# Altium footprint library Test.PcbLib: 245 footprints (part 5 of 17)
Each footprint in its own frame and in the unit in brackets; x right, y up, seen from the top. Pads: shape width x height; smd on the part's side, far side on the other; paste and mask are expansions set on the pad; w line width, h text height; cw(c..) or ccw(c..) is an arc to the next point about the centre after c.
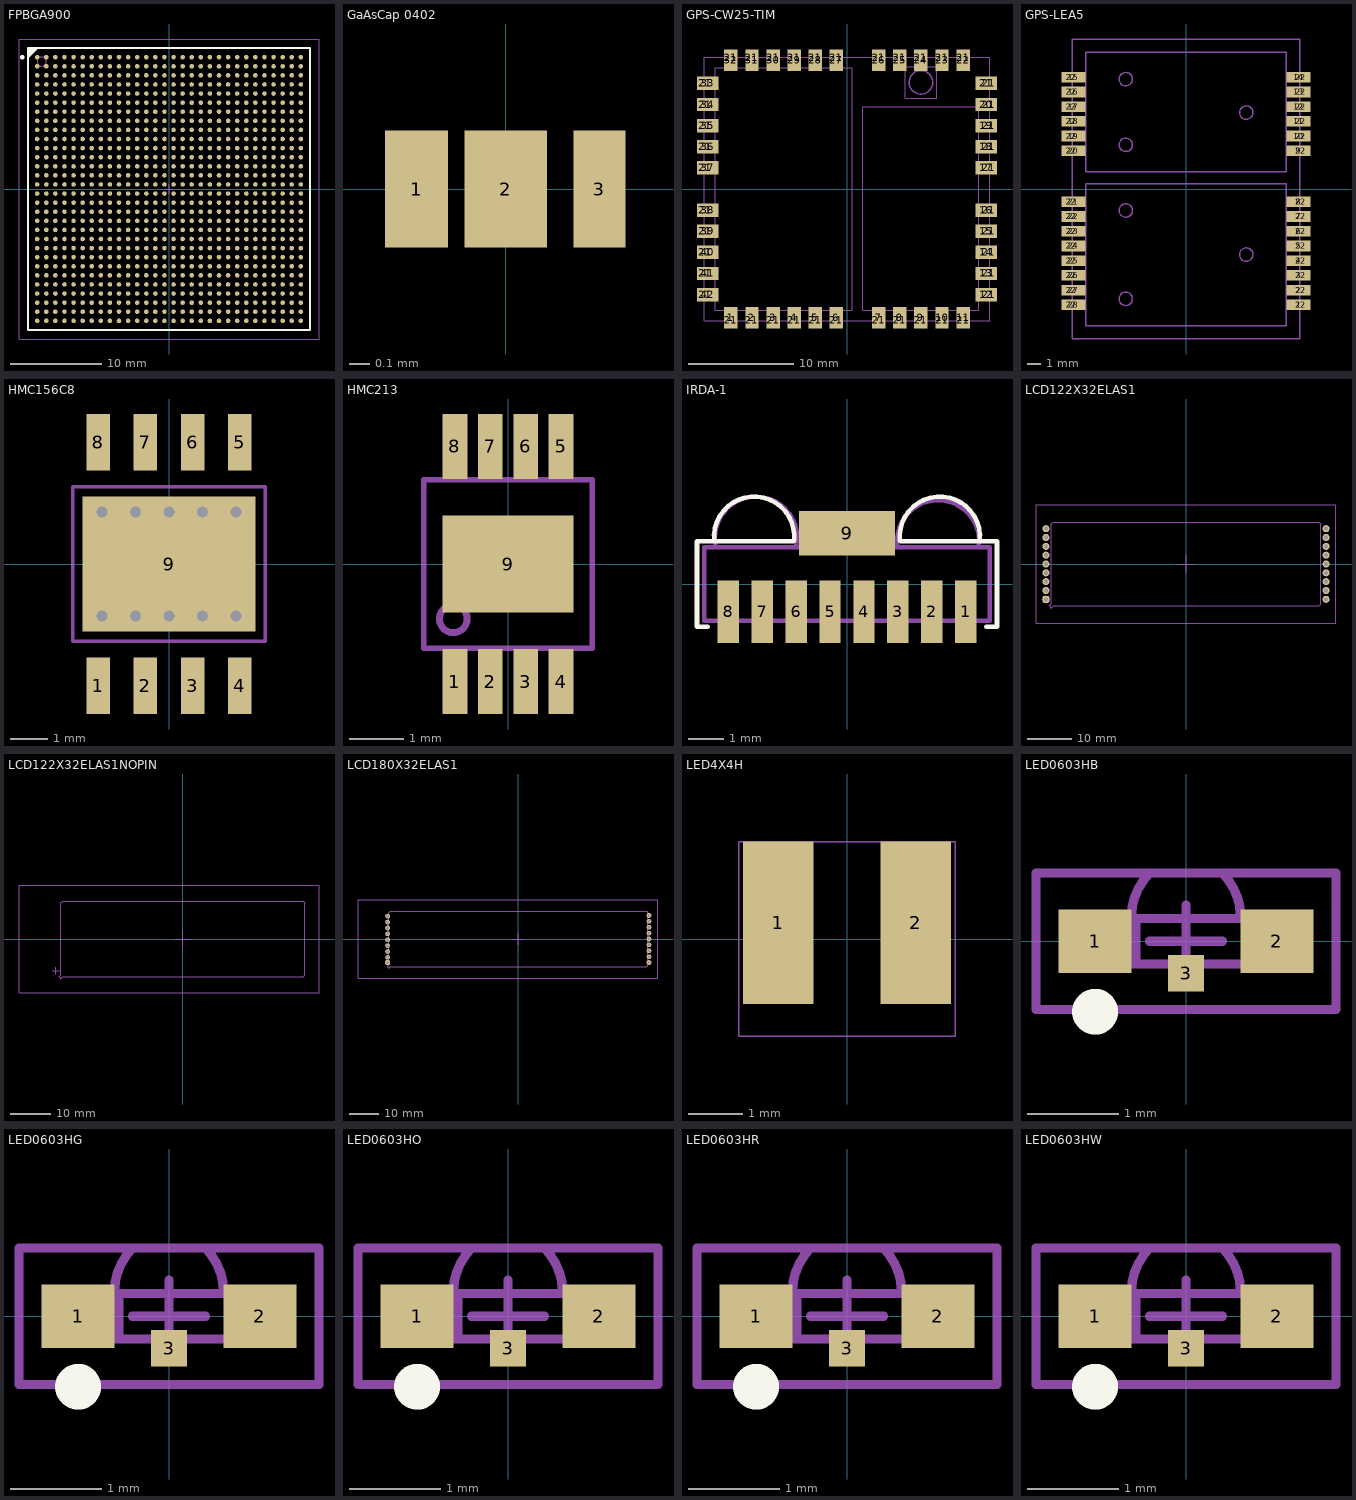
[diagram p4: the footprints below, top view; thin cyan lines are the x and y axes]

## FPBGA900 [mm] "BGA, 900-Leads, Body 31,0x31,0mm,  Pitch 1,00mm"
height 2.15
pads (900):
  round 0.5 smd: A1(-14.5,14.5) A2(-13.5,14.5) A3(-12.5,14.5) A4(-11.5,14.5) A5(-10.5,14.5) A6(-9.5,14.5) A7(-8.5,14.5) A8(-7.5,14.5) A9(-6.5,14.5) A10(-5.5,14.5) A11(-4.5,14.5) A12(-3.5,14.5) A13(-2.5,14.5) A14(-1.5,14.5) A15(-0.5,14.5) A16(0.5,14.5) A17(1.5,14.5) A18(2.5,14.5) A19(3.5,14.5) A20(4.5,14.5) A21(5.5,14.5) A22(6.5,14.5) A23(7.5,14.5) A24(8.5,14.5) A25(9.5,14.5) A26(10.5,14.5) A27(11.5,14.5) A28(12.5,14.5) A29(13.5,14.5) A30(14.5,14.5) AA1(-14.5,-5.5) AA2(-13.5,-5.5) AA3(-12.5,-5.5) AA4(-11.5,-5.5) AA5(-10.5,-5.5) AA6(-9.5,-5.5) AA7(-8.5,-5.5) AA8(-7.5,-5.5) AA9(-6.5,-5.5) AA10(-5.5,-5.5) AA11(-4.5,-5.5) AA12(-3.5,-5.5) AA13(-2.5,-5.5) AA14(-1.5,-5.5) AA15(-0.5,-5.5) AA16(0.5,-5.5) AA17(1.5,-5.5) AA18(2.5,-5.5) AA19(3.5,-5.5) AA20(4.5,-5.5) AA21(5.5,-5.5) AA22(6.5,-5.5) AA23(7.5,-5.5) AA24(8.5,-5.5) AA25(9.5,-5.5) AA26(10.5,-5.5) AA27(11.5,-5.5) AA28(12.5,-5.5) AA29(13.5,-5.5) AA30(14.5,-5.5) AB1(-14.5,-6.5) AB2(-13.5,-6.5) AB3(-12.5,-6.5) AB4(-11.5,-6.5) AB5(-10.5,-6.5) AB6(-9.5,-6.5) AB7(-8.5,-6.5) AB8(-7.5,-6.5) AB9(-6.5,-6.5) AB10(-5.5,-6.5) AB11(-4.5,-6.5) AB12(-3.5,-6.5) AB13(-2.5,-6.5) AB14(-1.5,-6.5) AB15(-0.5,-6.5) AB16(0.5,-6.5) AB17(1.5,-6.5) AB18(2.5,-6.5) AB19(3.5,-6.5) AB20(4.5,-6.5) AB21(5.5,-6.5) AB22(6.5,-6.5) AB23(7.5,-6.5) AB24(8.5,-6.5) AB25(9.5,-6.5) AB26(10.5,-6.5) AB27(11.5,-6.5) AB28(12.5,-6.5) AB29(13.5,-6.5) AB30(14.5,-6.5) AC1(-14.5,-7.5) AC2(-13.5,-7.5) AC3(-12.5,-7.5) AC4(-11.5,-7.5) AC5(-10.5,-7.5) AC6(-9.5,-7.5) AC7(-8.5,-7.5) AC8(-7.5,-7.5) AC9(-6.5,-7.5) AC10(-5.5,-7.5) AC11(-4.5,-7.5) AC12(-3.5,-7.5) AC13(-2.5,-7.5) AC14(-1.5,-7.5) AC15(-0.5,-7.5) AC16(0.5,-7.5) AC17(1.5,-7.5) AC18(2.5,-7.5) AC19(3.5,-7.5) AC20(4.5,-7.5) AC21(5.5,-7.5) AC22(6.5,-7.5) AC23(7.5,-7.5) AC24(8.5,-7.5) AC25(9.5,-7.5) AC26(10.5,-7.5) AC27(11.5,-7.5) AC28(12.5,-7.5) AC29(13.5,-7.5) AC30(14.5,-7.5) AD1(-14.5,-8.5) AD2(-13.5,-8.5) AD3(-12.5,-8.5) AD4(-11.5,-8.5) AD5(-10.5,-8.5) AD6(-9.5,-8.5) AD7(-8.5,-8.5) AD8(-7.5,-8.5) AD9(-6.5,-8.5) AD10(-5.5,-8.5) AD11(-4.5,-8.5) AD12(-3.5,-8.5) AD13(-2.5,-8.5) AD14(-1.5,-8.5) AD15(-0.5,-8.5) AD16(0.5,-8.5) AD17(1.5,-8.5) AD18(2.5,-8.5) AD19(3.5,-8.5) AD20(4.5,-8.5) AD21(5.5,-8.5) AD22(6.5,-8.5) AD23(7.5,-8.5) AD24(8.5,-8.5) AD25(9.5,-8.5) AD26(10.5,-8.5) AD27(11.5,-8.5) AD28(12.5,-8.5) AD29(13.5,-8.5) AD30(14.5,-8.5) AE1(-14.5,-9.5) AE2(-13.5,-9.5) AE3(-12.5,-9.5) AE4(-11.5,-9.5) AE5(-10.5,-9.5) AE6(-9.5,-9.5) AE7(-8.5,-9.5) AE8(-7.5,-9.5) AE9(-6.5,-9.5) AE10(-5.5,-9.5) AE11(-4.5,-9.5) AE12(-3.5,-9.5) AE13(-2.5,-9.5) AE14(-1.5,-9.5) AE15(-0.5,-9.5) AE16(0.5,-9.5) AE17(1.5,-9.5) AE18(2.5,-9.5) AE19(3.5,-9.5) AE20(4.5,-9.5) AE21(5.5,-9.5) AE22(6.5,-9.5) AE23(7.5,-9.5) AE24(8.5,-9.5) AE25(9.5,-9.5) AE26(10.5,-9.5) AE27(11.5,-9.5) AE28(12.5,-9.5) AE29(13.5,-9.5) AE30(14.5,-9.5) AF1(-14.5,-10.5) AF2(-13.5,-10.5) AF3(-12.5,-10.5) AF4(-11.5,-10.5) AF5(-10.5,-10.5) AF6(-9.5,-10.5) AF7(-8.5,-10.5) AF8(-7.5,-10.5) AF9(-6.5,-10.5) AF10(-5.5,-10.5) AF11(-4.5,-10.5) AF12(-3.5,-10.5) AF13(-2.5,-10.5) AF14(-1.5,-10.5) AF15(-0.5,-10.5) AF16(0.5,-10.5) AF17(1.5,-10.5) AF18(2.5,-10.5) AF19(3.5,-10.5) AF20(4.5,-10.5) AF21(5.5,-10.5) AF22(6.5,-10.5) AF23(7.5,-10.5) AF24(8.5,-10.5) AF25(9.5,-10.5) AF26(10.5,-10.5) AF27(11.5,-10.5) AF28(12.5,-10.5) AF29(13.5,-10.5) AF30(14.5,-10.5) AG1(-14.5,-11.5) AG2(-13.5,-11.5) AG3(-12.5,-11.5) AG4(-11.5,-11.5) AG5(-10.5,-11.5) AG6(-9.5,-11.5) AG7(-8.5,-11.5) AG8(-7.5,-11.5) AG9(-6.5,-11.5) AG10(-5.5,-11.5) AG11(-4.5,-11.5) AG12(-3.5,-11.5) AG13(-2.5,-11.5) AG14(-1.5,-11.5) AG15(-0.5,-11.5) AG16(0.5,-11.5) AG17(1.5,-11.5) AG18(2.5,-11.5) AG19(3.5,-11.5) AG20(4.5,-11.5) AG21(5.5,-11.5) AG22(6.5,-11.5) AG23(7.5,-11.5) AG24(8.5,-11.5) AG25(9.5,-11.5) AG26(10.5,-11.5) AG27(11.5,-11.5) AG28(12.5,-11.5) AG29(13.5,-11.5) AG30(14.5,-11.5) AH1(-14.5,-12.5) AH2(-13.5,-12.5) AH3(-12.5,-12.5) AH4(-11.5,-12.5) AH5(-10.5,-12.5) AH6(-9.5,-12.5) AH7(-8.5,-12.5) AH8(-7.5,-12.5) AH9(-6.5,-12.5) AH10(-5.5,-12.5) AH11(-4.5,-12.5) AH12(-3.5,-12.5) AH13(-2.5,-12.5) AH14(-1.5,-12.5) AH15(-0.5,-12.5) AH16(0.5,-12.5) AH17(1.5,-12.5) AH18(2.5,-12.5) AH19(3.5,-12.5) AH20(4.5,-12.5) AH21(5.5,-12.5) AH22(6.5,-12.5) AH23(7.5,-12.5) AH24(8.5,-12.5) AH25(9.5,-12.5) AH26(10.5,-12.5) AH27(11.5,-12.5) AH28(12.5,-12.5) AH29(13.5,-12.5) AH30(14.5,-12.5) AJ1(-14.5,-13.5) AJ2(-13.5,-13.5) AJ3(-12.5,-13.5) AJ4(-11.5,-13.5) AJ5(-10.5,-13.5) AJ6(-9.5,-13.5) AJ7(-8.5,-13.5) AJ8(-7.5,-13.5) AJ9(-6.5,-13.5) AJ10(-5.5,-13.5) AJ11(-4.5,-13.5) AJ12(-3.5,-13.5) AJ13(-2.5,-13.5) AJ14(-1.5,-13.5) AJ15(-0.5,-13.5) AJ16(0.5,-13.5) AJ17(1.5,-13.5) AJ18(2.5,-13.5) AJ19(3.5,-13.5) AJ20(4.5,-13.5) AJ21(5.5,-13.5) AJ22(6.5,-13.5) AJ23(7.5,-13.5) AJ24(8.5,-13.5) AJ25(9.5,-13.5) AJ26(10.5,-13.5) AJ27(11.5,-13.5) AJ28(12.5,-13.5) AJ29(13.5,-13.5) AJ30(14.5,-13.5) AK1(-14.5,-14.5) AK2(-13.5,-14.5) AK3(-12.5,-14.5) AK4(-11.5,-14.5) AK5(-10.5,-14.5) AK6(-9.5,-14.5) AK7(-8.5,-14.5) AK8(-7.5,-14.5) AK9(-6.5,-14.5) AK10(-5.5,-14.5) AK11(-4.5,-14.5) AK12(-3.5,-14.5) AK13(-2.5,-14.5) AK14(-1.5,-14.5) AK15(-0.5,-14.5) AK16(0.5,-14.5) AK17(1.5,-14.5) AK18(2.5,-14.5) AK19(3.5,-14.5) AK20(4.5,-14.5) AK21(5.5,-14.5) AK22(6.5,-14.5) AK23(7.5,-14.5) AK24(8.5,-14.5) AK25(9.5,-14.5) AK26(10.5,-14.5) AK27(11.5,-14.5) AK28(12.5,-14.5) AK29(13.5,-14.5) AK30(14.5,-14.5) B1(-14.5,13.5) B2(-13.5,13.5) B3(-12.5,13.5) B4(-11.5,13.5) B5(-10.5,13.5) B6(-9.5,13.5) B7(-8.5,13.5) B8(-7.5,13.5) B9(-6.5,13.5) B10(-5.5,13.5) B11(-4.5,13.5) B12(-3.5,13.5) B13(-2.5,13.5) B14(-1.5,13.5) B15(-0.5,13.5) B16(0.5,13.5) B17(1.5,13.5) B18(2.5,13.5) B19(3.5,13.5) B20(4.5,13.5) B21(5.5,13.5) B22(6.5,13.5) B23(7.5,13.5) B24(8.5,13.5) B25(9.5,13.5) B26(10.5,13.5) B27(11.5,13.5) B28(12.5,13.5) B29(13.5,13.5) B30(14.5,13.5) C1(-14.5,12.5) C2(-13.5,12.5) C3(-12.5,12.5) C4(-11.5,12.5) C5(-10.5,12.5) C6(-9.5,12.5) C7(-8.5,12.5) C8(-7.5,12.5) C9(-6.5,12.5) C10(-5.5,12.5) C11(-4.5,12.5) C12(-3.5,12.5) C13(-2.5,12.5) C14(-1.5,12.5) C15(-0.5,12.5) C16(0.5,12.5) C17(1.5,12.5) C18(2.5,12.5) C19(3.5,12.5) C20(4.5,12.5) C21(5.5,12.5) C22(6.5,12.5) C23(7.5,12.5) C24(8.5,12.5) C25(9.5,12.5) C26(10.5,12.5) C27(11.5,12.5) C28(12.5,12.5) C29(13.5,12.5) C30(14.5,12.5) D1(-14.5,11.5) D2(-13.5,11.5) D3(-12.5,11.5) D4(-11.5,11.5) D5(-10.5,11.5) D6(-9.5,11.5) D7(-8.5,11.5) D8(-7.5,11.5) D9(-6.5,11.5) D10(-5.5,11.5) D11(-4.5,11.5) D12(-3.5,11.5) D13(-2.5,11.5) D14(-1.5,11.5) D15(-0.5,11.5) D16(0.5,11.5) D17(1.5,11.5) D18(2.5,11.5) D19(3.5,11.5) D20(4.5,11.5) D21(5.5,11.5) D22(6.5,11.5) D23(7.5,11.5) D24(8.5,11.5) D25(9.5,11.5) D26(10.5,11.5) D27(11.5,11.5) D28(12.5,11.5) D29(13.5,11.5) D30(14.5,11.5) E1(-14.5,10.5) E2(-13.5,10.5) E3(-12.5,10.5) E4(-11.5,10.5) E5(-10.5,10.5) E6(-9.5,10.5) E7(-8.5,10.5) E8(-7.5,10.5) E9(-6.5,10.5) E10(-5.5,10.5) E11(-4.5,10.5) E12(-3.5,10.5) E13(-2.5,10.5) E14(-1.5,10.5) E15(-0.5,10.5) E16(0.5,10.5) E17(1.5,10.5) E18(2.5,10.5) E19(3.5,10.5) E20(4.5,10.5) E21(5.5,10.5) E22(6.5,10.5) E23(7.5,10.5) E24(8.5,10.5) E25(9.5,10.5) E26(10.5,10.5) E27(11.5,10.5) E28(12.5,10.5) E29(13.5,10.5) E30(14.5,10.5) F1(-14.5,9.5) F2(-13.5,9.5) F3(-12.5,9.5) F4(-11.5,9.5) F5(-10.5,9.5) F6(-9.5,9.5) F7(-8.5,9.5) F8(-7.5,9.5) F9(-6.5,9.5) F10(-5.5,9.5) F11(-4.5,9.5) F12(-3.5,9.5) F13(-2.5,9.5) F14(-1.5,9.5) F15(-0.5,9.5) F16(0.5,9.5) F17(1.5,9.5) F18(2.5,9.5) F19(3.5,9.5) F20(4.5,9.5) F21(5.5,9.5) F22(6.5,9.5) F23(7.5,9.5) F24(8.5,9.5) F25(9.5,9.5) F26(10.5,9.5) F27(11.5,9.5) F28(12.5,9.5) F29(13.5,9.5) F30(14.5,9.5) G1(-14.5,8.5) G2(-13.5,8.5) G3(-12.5,8.5) G4(-11.5,8.5) G5(-10.5,8.5) G6(-9.5,8.5) G7(-8.5,8.5) G8(-7.5,8.5) G9(-6.5,8.5) G10(-5.5,8.5) G11(-4.5,8.5) G12(-3.5,8.5) G13(-2.5,8.5) G14(-1.5,8.5) G15(-0.5,8.5) G16(0.5,8.5) G17(1.5,8.5) G18(2.5,8.5) G19(3.5,8.5) G20(4.5,8.5) G21(5.5,8.5) G22(6.5,8.5) G23(7.5,8.5) G24(8.5,8.5) G25(9.5,8.5) G26(10.5,8.5) G27(11.5,8.5) G28(12.5,8.5) G29(13.5,8.5) G30(14.5,8.5) H1(-14.5,7.5) H2(-13.5,7.5) H3(-12.5,7.5) H4(-11.5,7.5) H5(-10.5,7.5) H6(-9.5,7.5) H7(-8.5,7.5) H8(-7.5,7.5) H9(-6.5,7.5) H10(-5.5,7.5) H11(-4.5,7.5) H12(-3.5,7.5) H13(-2.5,7.5) H14(-1.5,7.5) H15(-0.5,7.5) H16(0.5,7.5) H17(1.5,7.5) H18(2.5,7.5) H19(3.5,7.5) H20(4.5,7.5) H21(5.5,7.5) H22(6.5,7.5) H23(7.5,7.5) H24(8.5,7.5) H25(9.5,7.5) H26(10.5,7.5) H27(11.5,7.5) H28(12.5,7.5) H29(13.5,7.5) H30(14.5,7.5) J1(-14.5,6.5) J2(-13.5,6.5) J3(-12.5,6.5) J4(-11.5,6.5) J5(-10.5,6.5) J6(-9.5,6.5) J7(-8.5,6.5) J8(-7.5,6.5) J9(-6.5,6.5) J10(-5.5,6.5) J11(-4.5,6.5) J12(-3.5,6.5) J13(-2.5,6.5) J14(-1.5,6.5) J15(-0.5,6.5) J16(0.5,6.5) J17(1.5,6.5) J18(2.5,6.5) J19(3.5,6.5) J20(4.5,6.5) J21(5.5,6.5) J22(6.5,6.5) J23(7.5,6.5) J24(8.5,6.5) J25(9.5,6.5) J26(10.5,6.5) J27(11.5,6.5) J28(12.5,6.5) J29(13.5,6.5) J30(14.5,6.5) K1(-14.5,5.5) K2(-13.5,5.5) K3(-12.5,5.5) K4(-11.5,5.5) K5(-10.5,5.5) K6(-9.5,5.5) K7(-8.5,5.5) K8(-7.5,5.5) K9(-6.5,5.5) K10(-5.5,5.5) K11(-4.5,5.5) K12(-3.5,5.5) K13(-2.5,5.5) K14(-1.5,5.5) K15(-0.5,5.5) K16(0.5,5.5) K17(1.5,5.5) K18(2.5,5.5) K19(3.5,5.5) K20(4.5,5.5) K21(5.5,5.5) K22(6.5,5.5) K23(7.5,5.5) K24(8.5,5.5) K25(9.5,5.5) K26(10.5,5.5) K27(11.5,5.5) K28(12.5,5.5) K29(13.5,5.5) K30(14.5,5.5) L1(-14.5,4.5) L2(-13.5,4.5) L3(-12.5,4.5) L4(-11.5,4.5) L5(-10.5,4.5) L6(-9.5,4.5) L7(-8.5,4.5) L8(-7.5,4.5) L9(-6.5,4.5) L10(-5.5,4.5) L11(-4.5,4.5) L12(-3.5,4.5) L13(-2.5,4.5) L14(-1.5,4.5) L15(-0.5,4.5) L16(0.5,4.5) L17(1.5,4.5) L18(2.5,4.5) L19(3.5,4.5) L20(4.5,4.5) L21(5.5,4.5) L22(6.5,4.5) L23(7.5,4.5) L24(8.5,4.5) L25(9.5,4.5) L26(10.5,4.5) L27(11.5,4.5) L28(12.5,4.5) L29(13.5,4.5) L30(14.5,4.5) M1(-14.5,3.5) M2(-13.5,3.5) M3(-12.5,3.5) M4(-11.5,3.5) M5(-10.5,3.5) M6(-9.5,3.5) M7(-8.5,3.5) M8(-7.5,3.5) M9(-6.5,3.5) M10(-5.5,3.5) M11(-4.5,3.5) M12(-3.5,3.5) M13(-2.5,3.5) M14(-1.5,3.5) M15(-0.5,3.5) M16(0.5,3.5) M17(1.5,3.5) M18(2.5,3.5) M19(3.5,3.5) M20(4.5,3.5) M21(5.5,3.5) M22(6.5,3.5) M23(7.5,3.5) M24(8.5,3.5) M25(9.5,3.5) M26(10.5,3.5) M27(11.5,3.5) M28(12.5,3.5) M29(13.5,3.5) M30(14.5,3.5) N1(-14.5,2.5) N2(-13.5,2.5) N3(-12.5,2.5) N4(-11.5,2.5) N5(-10.5,2.5) N6(-9.5,2.5) N7(-8.5,2.5) N8(-7.5,2.5) N9(-6.5,2.5) N10(-5.5,2.5) N11(-4.5,2.5) N12(-3.5,2.5) N13(-2.5,2.5) N14(-1.5,2.5) N15(-0.5,2.5) N16(0.5,2.5) N17(1.5,2.5) N18(2.5,2.5) N19(3.5,2.5) N20(4.5,2.5) N21(5.5,2.5) N22(6.5,2.5) N23(7.5,2.5) N24(8.5,2.5) N25(9.5,2.5) N26(10.5,2.5) N27(11.5,2.5) N28(12.5,2.5) N29(13.5,2.5) N30(14.5,2.5) P1(-14.5,1.5) P2(-13.5,1.5) P3(-12.5,1.5) P4(-11.5,1.5) P5(-10.5,1.5) P6(-9.5,1.5) P7(-8.5,1.5) P8(-7.5,1.5) P9(-6.5,1.5) P10(-5.5,1.5) P11(-4.5,1.5) P12(-3.5,1.5) P13(-2.5,1.5) P14(-1.5,1.5) P15(-0.5,1.5) P16(0.5,1.5) P17(1.5,1.5) P18(2.5,1.5) P19(3.5,1.5) P20(4.5,1.5) P21(5.5,1.5) P22(6.5,1.5) P23(7.5,1.5) P24(8.5,1.5) P25(9.5,1.5) P26(10.5,1.5) P27(11.5,1.5) P28(12.5,1.5) P29(13.5,1.5) P30(14.5,1.5) R1(-14.5,0.5) R2(-13.5,0.5) R3(-12.5,0.5) R4(-11.5,0.5) R5(-10.5,0.5) R6(-9.5,0.5) R7(-8.5,0.5) R8(-7.5,0.5) R9(-6.5,0.5) R10(-5.5,0.5) R11(-4.5,0.5) R12(-3.5,0.5) R13(-2.5,0.5) R14(-1.5,0.5) R15(-0.5,0.5) R16(0.5,0.5) R17(1.5,0.5) R18(2.5,0.5) R19(3.5,0.5) R20(4.5,0.5) R21(5.5,0.5) R22(6.5,0.5) R23(7.5,0.5) R24(8.5,0.5) R25(9.5,0.5) R26(10.5,0.5) R27(11.5,0.5) R28(12.5,0.5) R29(13.5,0.5) R30(14.5,0.5) T1(-14.5,-0.5) T2(-13.5,-0.5) T3(-12.5,-0.5) T4(-11.5,-0.5) T5(-10.5,-0.5) T6(-9.5,-0.5) T7(-8.5,-0.5) T8(-7.5,-0.5) T9(-6.5,-0.5) T10(-5.5,-0.5) T11(-4.5,-0.5) T12(-3.5,-0.5) T13(-2.5,-0.5) T14(-1.5,-0.5) T15(-0.5,-0.5) T16(0.5,-0.5) T17(1.5,-0.5) T18(2.5,-0.5) T19(3.5,-0.5) T20(4.5,-0.5) T21(5.5,-0.5) T22(6.5,-0.5) T23(7.5,-0.5) T24(8.5,-0.5) T25(9.5,-0.5) T26(10.5,-0.5) T27(11.5,-0.5) T28(12.5,-0.5) T29(13.5,-0.5) T30(14.5,-0.5) U1(-14.5,-1.5) U2(-13.5,-1.5) U3(-12.5,-1.5) U4(-11.5,-1.5) U5(-10.5,-1.5) U6(-9.5,-1.5) U7(-8.5,-1.5) U8(-7.5,-1.5) U9(-6.5,-1.5) U10(-5.5,-1.5) U11(-4.5,-1.5) U12(-3.5,-1.5) U13(-2.5,-1.5) U14(-1.5,-1.5) U15(-0.5,-1.5) U16(0.5,-1.5) U17(1.5,-1.5) U18(2.5,-1.5) U19(3.5,-1.5) U20(4.5,-1.5) U21(5.5,-1.5) U22(6.5,-1.5) U23(7.5,-1.5) U24(8.5,-1.5) U25(9.5,-1.5) U26(10.5,-1.5) U27(11.5,-1.5) U28(12.5,-1.5) U29(13.5,-1.5) U30(14.5,-1.5) V1(-14.5,-2.5) V2(-13.5,-2.5) V3(-12.5,-2.5) V4(-11.5,-2.5) V5(-10.5,-2.5) V6(-9.5,-2.5) V7(-8.5,-2.5) V8(-7.5,-2.5) V9(-6.5,-2.5) V10(-5.5,-2.5) V11(-4.5,-2.5) V12(-3.5,-2.5) V13(-2.5,-2.5) V14(-1.5,-2.5) V15(-0.5,-2.5) V16(0.5,-2.5) V17(1.5,-2.5) V18(2.5,-2.5) V19(3.5,-2.5) V20(4.5,-2.5) V21(5.5,-2.5) V22(6.5,-2.5) V23(7.5,-2.5) V24(8.5,-2.5) V25(9.5,-2.5) V26(10.5,-2.5) V27(11.5,-2.5) V28(12.5,-2.5) V29(13.5,-2.5) V30(14.5,-2.5) W1(-14.5,-3.5) W2(-13.5,-3.5) W3(-12.5,-3.5) W4(-11.5,-3.5) W5(-10.5,-3.5) W6(-9.5,-3.5) W7(-8.5,-3.5) W8(-7.5,-3.5) W9(-6.5,-3.5) W10(-5.5,-3.5) W11(-4.5,-3.5) W12(-3.5,-3.5) W13(-2.5,-3.5) W14(-1.5,-3.5) W15(-0.5,-3.5) W16(0.5,-3.5) W17(1.5,-3.5) W18(2.5,-3.5) W19(3.5,-3.5) W20(4.5,-3.5) W21(5.5,-3.5) W22(6.5,-3.5) W23(7.5,-3.5) W24(8.5,-3.5) W25(9.5,-3.5) W26(10.5,-3.5) W27(11.5,-3.5) W28(12.5,-3.5) W29(13.5,-3.5) W30(14.5,-3.5) Y1(-14.5,-4.5) Y2(-13.5,-4.5) Y3(-12.5,-4.5) Y4(-11.5,-4.5) Y5(-10.5,-4.5) Y6(-9.5,-4.5) Y7(-8.5,-4.5) Y8(-7.5,-4.5) Y9(-6.5,-4.5) Y10(-5.5,-4.5) Y11(-4.5,-4.5) Y12(-3.5,-4.5) Y13(-2.5,-4.5) Y14(-1.5,-4.5) Y15(-0.5,-4.5) Y16(0.5,-4.5) Y17(1.5,-4.5) Y18(2.5,-4.5) Y19(3.5,-4.5) Y20(4.5,-4.5) Y21(5.5,-4.5) Y22(6.5,-4.5) Y23(7.5,-4.5) Y24(8.5,-4.5) Y25(9.5,-4.5) Y26(10.5,-4.5) Y27(11.5,-4.5) Y28(12.5,-4.5) Y29(13.5,-4.5) Y30(14.5,-4.5)
Top Overlay:
  circle w0.25: c-16.15,14.5 r0.125
  region: -14.5,15.5 -15.5,14.5 -15.5,15.5
  lines w0.2: -15.5,14.5 -14.5,15.5 ; -15.5,-15.5 -15.5,15.5 15.5,15.5 15.5,-15.5 -15.5,-15.5
Mechanical 13:
  lines w0.1: -15.5,-15.5 -15.5,15.5 15.5,15.5 15.5,-15.5 -15.5,-15.5
  lines w0.127: -14.01,13.5 cw(c-14.01,14) -14.51,14 cw(c-14,14) -14,14.51 cw(c-14,14.01) -13.5,14.01 ; -14,13.5 ccw(c-14,14) -13.5,14
Mechanical 15:
  lines w0.1: -0.5,0 0.5,0 ; 0,-0.5 0,0.5 ; -16.5,-16.5 -16.5,16.5 16.5,16.5 16.5,-16.5 -16.5,-16.5
3D body: height 2.16, standoff 2.1, extent -14.51,13.49 -13.49,14.51
3D body: height 2.15, standoff 0.5, extent -15.5,-15.5 15.5,15.5

## GaAsCap 0402 [mm] "Transistor GaAs chip 0402"
height 0.25
pads (3):
  rect 0.3x0.56 smd paste+0 mask+0: 1(-0.427,0)
  rect 0.395x0.56 smd paste+0 mask+0: 2(0,0)
  rect 0.25x0.56 smd paste+0 mask+0: 3(0.447,0)
3D body: height 0.26, standoff 0.25, extent -0.44,-0.262 -0.22,-0.042
3D body: height 0.25, standoff 0, extent -0.525,-0.275 0.525,0.275

## GPS-CW25-TIM [mm] "GPS Module 27x25mm 42pin; RFin pin omited"
height 4.2
pads (84):
  rect 1.27x2.03 smd paste-2: 1(-11,-12.19) 2(-9,-12.19) 3(-7,-12.19) 4(-5,-12.19) 5(-3,-12.19) 6(-1,-12.19) 7(3,-12.19) 8(5,-12.19) 9(7,-12.19) 10(9,-12.19) 11(11,-12.19) 22(11,12.19) 23(9,12.19) 24(7,12.19) 25(5,12.19) 26(3,12.19) 27(-1,12.19) 28(-3,12.19) 29(-5,12.19) 30(-7,12.19) 31(-9,12.19) 32(-11,12.19)
  rect 2.03x1.27 smd paste-2: 12(13.19,-10) 13(13.19,-8) 14(13.19,-6) 15(13.19,-4) 16(13.19,-2) 17(13.19,2) 18(13.19,4) 19(13.19,6) 20(13.19,8) 21(13.19,10) 33(-13.19,10) 34(-13.19,8) 35(-13.19,6) 36(-13.19,4) 37(-13.19,2) 38(-13.19,-2) 39(-13.19,-4) 40(-13.19,-6) 41(-13.19,-8) 42(-13.19,-10)
  rect 1.5x1.27 on Top Paste: 21(-13.44,-10) 21(-13.44,-8) 21(-13.44,-6) 21(-13.44,-4) 21(-13.44,-2) 21(-13.44,2) 21(-13.44,4) 21(-13.44,6) 21(-13.44,8) 21(-13.44,10) 21(13.44,-10) 21(13.44,-8) 21(13.44,-6) 21(13.44,-4) 21(13.44,-2) 21(13.44,2) 21(13.44,4) 21(13.44,6) 21(13.44,8) 21(13.44,10)
  rect 1.27x1.5 on Top Paste: 21(-11,-12.44) 21(-11,12.44) 21(-9,-12.44) 21(-9,12.44) 21(-7,-12.44) 21(-7,12.44) 21(-5,-12.44) 21(-5,12.44) 21(-3,-12.44) 21(-3,12.44) 21(-1,-12.44) 21(-1,12.44) 21(3,-12.44) 21(3,12.44) 21(5,-12.44) 21(5,12.44) 21(7,12.44) 21(7,-12.44) 21(9,-12.44) 21(9,12.44) 21(11,-12.44) 21(11,12.44)
Mechanical 13:
  lines w0.102: -13.5,-12.5 13.5,-12.5 13.5,12.5 -13.5,12.5 -13.5,-12.5 ; -12.5,-11.5 0.5,-11.5 0.5,11.5 -12.5,11.5 -12.5,-11.5 ; 1.5,-11.5 1.5,7.8 12.5,7.8 12.5,-11.5 1.5,-11.5 ; 5.5,8.6 5.5,11.6 8.5,11.6 8.5,8.6 5.5,8.6
  lines w0.15: 8.113,10.201 ccw(c7,10.1) 8.118,10.1
3D body: height 4.2, standoff 2.5, extent 5.891,8.991 8.128,11.209
3D body: height 2.5, standoff 1.5, extent 5.5,8.6 8.5,11.6
3D body: height 4.2, standoff 1.5, extent -12.5,-11.5 0.5,11.5
3D body: height 4.2, standoff 1.5, extent 1.5,-11.5 12.5,7.8
3D body: height 1, standoff 0, extent -13.5,-12.5 13.5,12.5

## GPS-LEA5 [mm] "17X22.4mm 28-pin GPS module"
height 3
pads (56):
  rect 1.8x0.8 smd paste-2: 1(8.4,-8.65) 2(8.4,-7.55) 3(8.4,-6.45) 4(8.4,-5.35) 5(8.4,-4.25) 6(8.4,-3.15) 7(8.4,-2.05) 8(8.4,-0.95) 9(8.4,2.85) 10(8.4,3.95) 11(8.4,5.05) 12(8.4,6.15) 13(8.4,7.25) 14(8.4,8.35) 15(-8.4,8.35) 16(-8.4,7.25) 17(-8.4,6.15) 18(-8.4,5.05) 19(-8.4,3.95) 20(-8.4,2.85) 21(-8.4,-0.95) 22(-8.4,-2.05) 23(-8.4,-3.15) 24(-8.4,-4.25) 25(-8.4,-5.35) 26(-8.4,-6.45) 27(-8.4,-7.55) 28(-8.4,-8.65)
  rect 1.5x0.8 on Top Paste: 22(-8.55,-8.65) 22(-8.55,-7.55) 22(-8.55,-6.45) 22(-8.55,-5.35) 22(-8.55,-4.25) 22(-8.55,-3.15) 22(-8.55,-2.05) 22(-8.55,-0.95) 22(-8.55,2.85) 22(-8.55,3.95) 22(-8.55,5.05) 22(-8.55,6.15) 22(-8.55,7.25) 22(-8.55,8.35) 22(8.55,-8.65) 22(8.55,-7.55) 22(8.55,-6.45) 22(8.55,-5.35) 22(8.55,-4.25) 22(8.55,-3.15) 22(8.55,-2.05) 22(8.55,-0.95) 22(8.55,2.85) 22(8.55,3.95) 22(8.55,5.05) 22(8.55,6.15) 22(8.55,7.25) 22(8.55,8.35)
Mechanical 13:
  circle w0.102: c-4.5,-8.2 r0.5
  circle w0.102: c-4.5,-1.6 r0.5
  circle w0.102: c4.5,-4.9 r0.5
  circle w0.102: c4.5,5.7 r0.5
  circle w0.102: c-4.5,8.2 r0.5
  circle w0.102: c-4.5,3.3 r0.5
  lines w0.102: -8.5,-11.2 -8.5,11.2 8.5,11.2 8.5,-11.2 -8.5,-11.2 ; -7.5,-10.2 -7.5,0.4 7.5,0.4 7.5,-10.2 -7.5,-10.2 ; -7.5,1.3 7.5,1.3 7.5,10.2 -7.5,10.2 -7.5,1.3
3D body: height 3.4, standoff 1, extent -7.5,1.3 7.5,10.2
3D body: height 3.4, standoff 1, extent -7.5,-10.2 7.5,0.4
3D body: height 1, standoff 0, extent -8.5,-11.2 8.5,11.2
3D body: height 3.41, standoff 3.4, extent -5.01,-8.71 -3.99,-7.69
3D body: height 3.41, standoff 3.4, extent -5.01,-2.11 -3.99,-1.09
3D body: height 3.41, standoff 3.4, extent 3.99,-5.41 5.01,-4.39
3D body: height 3.41, standoff 3.4, extent 3.99,5.19 5.01,6.21
3D body: height 3.41, standoff 3.4, extent -5.01,7.69 -3.99,8.71
3D body: height 3.41, standoff 3.4, extent -5.01,2.79 -3.99,3.81

## HMC156C8 [mil]
pads (9):
  rect 25x60 smd: 1(-75,-129) 2(-25,-129) 3(25,-129) 4(75,-129) 5(75,129) 6(25,129) 7(-25,129) 8(-75,129)
  rect 183x143 smd paste-196.85 mask-196.85: 9(0,0)
via 0,55.12 diameter 25.59 hole 11.81
via 70.87,55.12 diameter 25.59 hole 11.81
via 35.43,55.12 diameter 25.59 hole 11.81
via -35.43,55.12 diameter 25.59 hole 11.81
via -70.87,55.12 diameter 25.59 hole 11.81
via -70.87,-55.12 diameter 25.59 hole 11.81
via -35.43,-55.12 diameter 25.59 hole 11.81
via 35.43,-55.12 diameter 25.59 hole 11.81
via 70.87,-55.12 diameter 25.59 hole 11.81
via 0,-55.12 diameter 25.59 hole 11.81
Top Paste:
  region: -90.55,49.21 -82.68,49.21 -76.77,43.31 -64.96,43.31 -59.06,49.21 -53.15,49.21 -53.15,0 -90.55,0
  region: -56.1,49.21 -47.24,49.21 -41.34,43.31 -29.53,43.31 -23.62,49.21 -17.72,49.21 -17.72,0 -56.1,0
  region: -20.67,49.21 -11.81,49.21 -5.91,43.31 5.91,43.31 11.81,49.21 17.72,49.21 17.72,0 -20.67,0
  region: 14.76,49.21 23.62,49.21 29.53,43.31 41.34,43.31 47.24,49.21 53.15,49.21 53.15,0 14.76,0
  region: 90.55,49.21 82.68,49.21 76.77,43.31 64.96,43.31 59.06,49.21 53.15,49.21 53.15,0 90.55,0
  region: 90.55,-49.21 82.68,-49.21 76.77,-43.31 64.96,-43.31 59.06,-49.21 53.15,-49.21 53.15,0 90.55,0
  region: 56.1,-49.21 47.24,-49.21 41.34,-43.31 29.53,-43.31 23.62,-49.21 17.72,-49.21 17.72,0 56.1,0
  region: 20.67,-49.21 11.81,-49.21 5.91,-43.31 -5.91,-43.31 -11.81,-49.21 -17.72,-49.21 -17.72,0 20.67,0
  region: -14.76,-49.21 -23.62,-49.21 -29.53,-43.31 -41.34,-43.31 -47.24,-49.21 -53.15,-49.21 -53.15,0 -14.76,0
  region: -90.55,-49.21 -81.69,-49.21 -75.79,-43.31 -63.98,-43.31 -58.07,-49.21 -52.17,-49.21 -52.17,0 -90.55,0
  region: -90.55,61.02 -82.68,61.02 -76.77,66.93 -76.77,70.87 -90.55,70.87
  region: -64.96,70.87 -64.96,66.93 -59.06,61.02 -47.24,61.02 -41.34,66.93 -41.34,70.87
  region: -29.53,70.87 -29.53,66.93 -23.62,61.02 -11.81,61.02 -5.91,66.93 -5.91,70.87
  region: 5.91,70.87 5.91,66.93 11.81,61.02 23.62,61.02 29.53,66.93 29.53,70.87
  region: 41.34,70.87 41.34,66.93 47.24,61.02 59.06,61.02 64.96,66.93 64.96,70.87
  region: -64.96,-70.87 -64.96,-66.93 -59.06,-61.02 -47.24,-61.02 -41.34,-66.93 -41.34,-70.87
  region: -29.53,-70.87 -29.53,-66.93 -23.62,-61.02 -11.81,-61.02 -5.91,-66.93 -5.91,-70.87
  region: 5.91,-70.87 5.91,-66.93 11.81,-61.02 23.62,-61.02 29.53,-66.93 29.53,-70.87
  region: 41.34,-70.87 41.34,-66.93 47.24,-61.02 59.06,-61.02 64.96,-66.93 64.96,-70.87
  region: -90.55,-61.02 -82.68,-61.02 -76.77,-66.93 -76.77,-70.87 -90.55,-70.87
  region: 90.55,-61.02 82.68,-61.02 76.77,-66.93 76.77,-70.87 90.55,-70.87
  region: 90.55,61.02 82.68,61.02 76.77,66.93 76.77,70.87 90.55,70.87
Top Solder:
  drawing of 10 lines, arcs and shapes, not listed
Mechanical 13:
  circle w5: c-77,-58 r10
  lines w4: -102,-82 -102,82 102,82 102,-82 -102,-82
3D body: height 94.88, standoff 0, extent -102,-82 102,82
3D body: height 95.28, standoff 94.88, extent -87.2,-68.2 -66.8,-47.8

## HMC213 [mil]
pads (9):
  rect 18x47 smd mask+2: 1(-38.4,-85) 2(-12.8,-85) 3(12.8,-85) 4(38.4,-85) 5(38.4,85) 6(12.8,85) 7(-12.8,85) 8(-38.4,85)
  rect 95x70 smd mask+2: 9(0,0)
Mechanical 13:
  lines w4: -61,-61 -61,61 61,61 61,-61 -61,-61
  lines w5: -49.56,-39.69 cw(c-39.56,-39.69) -39.56,-29.69 cw(c-39.56,-39.69) -29.56,-39.69 cw(c-39.56,-39.69) -39.56,-49.69 cw(c-39.56,-39.69) -49.56,-39.69
3D body: height 43.31, standoff 5.91, extent -61,-61 61,61
3D body: height 45.28, standoff 43.31, extent -49.75,-49.88 -29.36,-29.49

## IRDA-1 [mm] "HSDL-3201#001"
height 2.5
pads (9):
  rect 0.6x1.75 smd: 1(3.325,-0.775) 2(2.375,-0.775) 3(1.425,-0.775) 4(0.475,-0.775) 5(-0.475,-0.775) 6(-1.425,-0.775) 7(-2.375,-0.775) 8(-3.325,-0.775)
  rect 2.7x1.25 smd: 9(0,1.425)
Top Overlay:
  lines w0.127: -3.9,-1.2 -4.2,-1.2 -4.2,1.2 -1.5,1.2 ; -3.718,1.203 cw(c-2.6,1.325) -1.481,1.207 ; 1.481,1.207 cw(c2.6,1.325) 3.718,1.203 ; 1.5,1.2 4.2,1.2 4.2,-1.2 3.9,-1.2
Mechanical 13:
  lines w0.127: -3.683,1.1 cw(c-2.55,1.3) -1.417,1.1 ; -1.05,1.025 -1.05,1.825 1.05,1.825 1.05,1.025 ; 1.411,1.04 cw(c2.55,1.2) 3.689,1.04 ; -4,-1.025 4,-1.025 4,1.025 -4,1.025 -4,-1.025
3D body: height 2.3, standoff 0.3, extent 1.397,1.04 3.708,2.362
3D body: height 2.3, standoff 0.3, extent -3.683,1.025 -1.397,2.464
3D body: height 2.6, standoff 0, extent -4,-1.025 4,1.025

## LCD122X32ELAS1 [mm]
pads (18):
  rrect50% 1.6x1.6 hole 0.9: 1(-31.75,-8)
  round 1.6 hole 0.9: 2(-31.75,-6) 3(-31.75,-4) 4(-31.75,-2) 5(-31.75,0) 6(-31.75,2) 7(-31.75,4) 8(-31.75,6) 9(-31.75,8) 10(31.75,8) 11(31.75,6) 12(31.75,4) 13(31.75,2) 14(31.75,0) 15(31.75,-2) 16(31.75,-4) 17(31.75,-6) 18(31.75,-8)
Mechanical 13:
  lines w0.102: -34,-13.4 -34,13.4 34,13.4 34,-13.4 -34,-13.4 ; -31,-9.5 -30.5,-10 -30,-9.5 30.1,-9.5 30.5,-9.1 30.5,9.1 30.1,9.5 -30.1,9.5 -30.5,9.1 -30.5,-9 -31,-9.5
Mechanical 15:
  lines w0.102: -32.65,-8 -30.875,-8 ; -31.75,-8.875 -31.75,-7.125 ; -2.032,0 2.032,0 ; 0,-2.032 0,2.032
3D body: height 10.8, standoff 0, extent -34.075,-13.375 33.925,13.425

## LCD122X32ELAS1NOPIN [mm]
Mechanical 13:
  lines w0.1: -41,-13.4 -41,13.4
  lines w0.102: -41,-13.4 34,-13.4 ; -41,13.4 34,13.4 34,-13.4 ; -34,-13.4 34,-13.4 ; -31,-9.5 -30.5,-10 -30,-9.5 30.1,-9.5 30.5,-9.1 30.5,9.1 30.1,9.5 -30.1,9.5 -30.5,9.1 -30.5,-9 -31,-9.5
Mechanical 15:
  lines w0.102: -32.65,-8 -30.875,-8 ; -31.75,-8.875 -31.75,-7.125 ; -2.032,0 2.032,0 ; 0,-2.032 0,2.032
3D body: height 14.8, standoff 4, extent -30.509,-9.51 30.51,9.51
3D body: height 14.8, standoff 4, extent -41,-13.4 34,13.4

## LCD180X32ELAS1 [mm]
height 10.8
pads (18):
  rrect50% 1.6x1.6 hole 0.9: 1(-44.45,-8)
  round 1.6 hole 0.9: 2(-44.45,-6.25) 3(-44.45,-4.25) 4(-44.45,-2.25) 5(-44.45,-0.25) 6(-44.45,1.75) 7(-44.45,3.75) 8(-44.45,5.75) 9(-44.45,7.75) 10(44.45,8) 11(44.45,6) 12(44.45,4) 13(44.45,2) 14(44.45,0) 15(44.45,-2) 16(44.45,-4) 17(44.45,-6) 18(44.45,-8)
Mechanical 13:
  lines w0.102: -54.5,-13.4 -54.5,13.4 47.5,13.4 47.5,-13.4 -54.5,-13.4 ; -44.5,-9.5 -44,-10 -43.5,-9.5 43.6,-9.5 44,-9.1 44,9.1 43.6,9.5 -43.6,9.5 -44,9.1 -44,-9 -44.5,-9.5
Mechanical 15:
  lines w0.102: -2.032,0 2.032,0 ; 0,-2.032 0,2.032
3D body: height 14.8, standoff 4, extent -54.5,-13.4 47.5,13.4
3D body: height 14.8, standoff 4, extent -44.02,-9.51 44.01,9.51

## LED4X4H [mm] "Sideled 4x4mm horizontal SMD"
height 4
pads (2):
  rect 1.3x3 smd: 1(-1.27,0.3) 2(1.27,0.3)
Mechanical 13:
  lines w0.025: -2,-1.8 -2,1.8 2,1.8 2,-1.8 -2,-1.8
3D body: height 3.8, standoff 1.4, extent -1.2,-1.825 1.2,-1.8
3D body: height 1, standoff 0, extent -2,-1.8 2,1.8
3D body: height 3, standoff 1, extent -2,-1.8 2,-0.3
3D body: height 4, standoff 3, extent -2,-1.8 2,1.8

## LED0603HB [mm] "LED chip 0603 1.6x1.0x0.6mm horizontal Blue"
height 1
pads (3):
  rect 0.8x0.7 smd: 1(-1,0) 2(1,0)
  rect 0.4x0.4 smd: 3(0,-0.35)
Top Overlay:
  circle w0.254: c-1,-0.775 r0.125
Mechanical 13:
  rectangle: -0.8,-0.25 -0.5,0.25
  lines w0.1: -0.8,-0.25 -0.8,0.25 0.8,0.25 0.8,-0.25 -0.8,-0.25
  lines w0.102: -0.6,0.25 -0.6,0.267 cw(c0.083,0.267) -0.4,0.75 0.4,0.75 cw(c-0.083,0.267) 0.6,0.267
Mechanical 15:
  lines w0.1: -0.4,0 0.4,0 ; 0,-0.4 0,0.4 ; -1.65,-0.75 -1.65,0.75 1.65,0.75 1.65,-0.75 -1.65,-0.75
3D body: height 0.61, standoff 0.6, extent -0.8,-0.25 -0.5,0.25
3D body: height 0.6, standoff 0, extent -0.8,-0.25 0.8,0.25
3D body: height 0.6, standoff 0, extent -0.6,0.25 0.6,0.75

## LED0603HG [mm] "LED chip 0603 1.6x1.0x0.6mm horizontal Green"
height 1
pads (3):
  rect 0.8x0.7 smd: 1(-1,0) 2(1,0)
  rect 0.4x0.4 smd: 3(0,-0.35)
Top Overlay:
  circle w0.254: c-1,-0.775 r0.125
Mechanical 13:
  rectangle: -0.8,-0.25 -0.5,0.25
  lines w0.1: -0.8,-0.25 0.8,-0.25 0.8,0.25 -0.8,0.25 -0.8,-0.25
  lines w0.102: -0.6,0.25 -0.6,0.267 cw(c0.083,0.267) -0.4,0.75 0.4,0.75 cw(c-0.083,0.267) 0.6,0.267
Mechanical 15:
  lines w0.1: -0.4,0 0.4,0 ; 0,-0.4 0,0.4 ; -1.65,-0.75 1.65,-0.75 1.65,0.75 -1.65,0.75 -1.65,-0.75
3D body: height 0.6, standoff 0, extent -0.6,0.25 0.6,0.75
3D body: height 0.6, standoff 0, extent -0.8,-0.25 0.8,0.25
3D body: height 0.61, standoff 0.6, extent -0.8,-0.25 -0.5,0.25

## LED0603HO [mm] "LED chip 0603 1.6x1.0x0.6mm horizontal Orange"
height 1
pads (3):
  rect 0.8x0.7 smd: 1(-1,0) 2(1,0)
  rect 0.4x0.4 smd: 3(0,-0.35)
Top Overlay:
  circle w0.254: c-1,-0.775 r0.125
Mechanical 13:
  rectangle: -0.8,-0.25 -0.5,0.25
  lines w0.1: -0.8,-0.25 0.8,-0.25 0.8,0.25 -0.8,0.25 -0.8,-0.25
  lines w0.102: -0.6,0.25 -0.6,0.267 cw(c0.083,0.267) -0.4,0.75 0.4,0.75 cw(c-0.083,0.267) 0.6,0.267
Mechanical 15:
  lines w0.1: -0.4,0 0.4,0 ; 0,-0.4 0,0.4 ; -1.65,-0.75 1.65,-0.75 1.65,0.75 -1.65,0.75 -1.65,-0.75
3D body: height 0.6, standoff 0, extent -0.6,0.25 0.6,0.75
3D body: height 0.6, standoff 0, extent -0.8,-0.25 0.8,0.25
3D body: height 0.61, standoff 0.6, extent -0.8,-0.25 -0.5,0.25

## LED0603HR [mm] "LED chip 0603 1.6x1.0x0.6mm horizontal Red"
height 1
pads (3):
  rect 0.8x0.7 smd: 1(-1,0) 2(1,0)
  rect 0.4x0.4 smd: 3(0,-0.35)
Top Overlay:
  circle w0.254: c-1,-0.775 r0.125
Mechanical 13:
  rectangle: -0.8,-0.25 -0.5,0.25
  lines w0.1: -0.8,-0.25 -0.8,0.25 0.8,0.25 0.8,-0.25 -0.8,-0.25
  lines w0.102: -0.6,0.25 -0.6,0.267 cw(c0.083,0.267) -0.4,0.75 0.4,0.75 cw(c-0.083,0.267) 0.6,0.267
Mechanical 15:
  lines w0.1: -0.4,0 0.4,0 ; 0,-0.4 0,0.4 ; -1.65,-0.75 -1.65,0.75 1.65,0.75 1.65,-0.75 -1.65,-0.75
3D body: height 0.61, standoff 0.6, extent -0.8,-0.25 -0.5,0.25
3D body: height 0.6, standoff 0, extent -0.8,-0.25 0.8,0.25
3D body: height 0.6, standoff 0, extent -0.6,0.25 0.6,0.75

## LED0603HW [mm] "LED chip 0603 1.6x1.0x0.6mm horizontal White"
height 1
pads (3):
  rect 0.8x0.7 smd: 1(-1,0) 2(1,0)
  rect 0.4x0.4 smd: 3(0,-0.35)
Top Overlay:
  circle w0.254: c-1,-0.775 r0.125
Mechanical 13:
  rectangle: -0.8,-0.25 -0.5,0.25
  lines w0.1: -0.8,-0.25 0.8,-0.25 0.8,0.25 -0.8,0.25 -0.8,-0.25
  lines w0.102: -0.6,0.25 -0.6,0.267 cw(c0.083,0.267) -0.4,0.75 0.4,0.75 cw(c-0.083,0.267) 0.6,0.267
Mechanical 15:
  lines w0.1: -0.4,0 0.4,0 ; 0,-0.4 0,0.4 ; -1.65,-0.75 1.65,-0.75 1.65,0.75 -1.65,0.75 -1.65,-0.75
3D body: height 0.6, standoff 0, extent -0.6,0.25 0.6,0.75
3D body: height 0.6, standoff 0, extent -0.8,-0.25 0.8,0.25
3D body: height 0.61, standoff 0.6, extent -0.8,-0.25 -0.5,0.25